# Altium footprint library ConnectMedical.PcbLib: 70 footprints (part 4 of 5)
Each footprint in its own frame and in the unit in brackets; x right, y up, seen from the top. Pads: shape width x height; smd on the part's side, far side on the other; paste and mask are expansions set on the pad; w line width, h text height; cw(c..) or ccw(c..) is an arc to the next point about the centre after c.
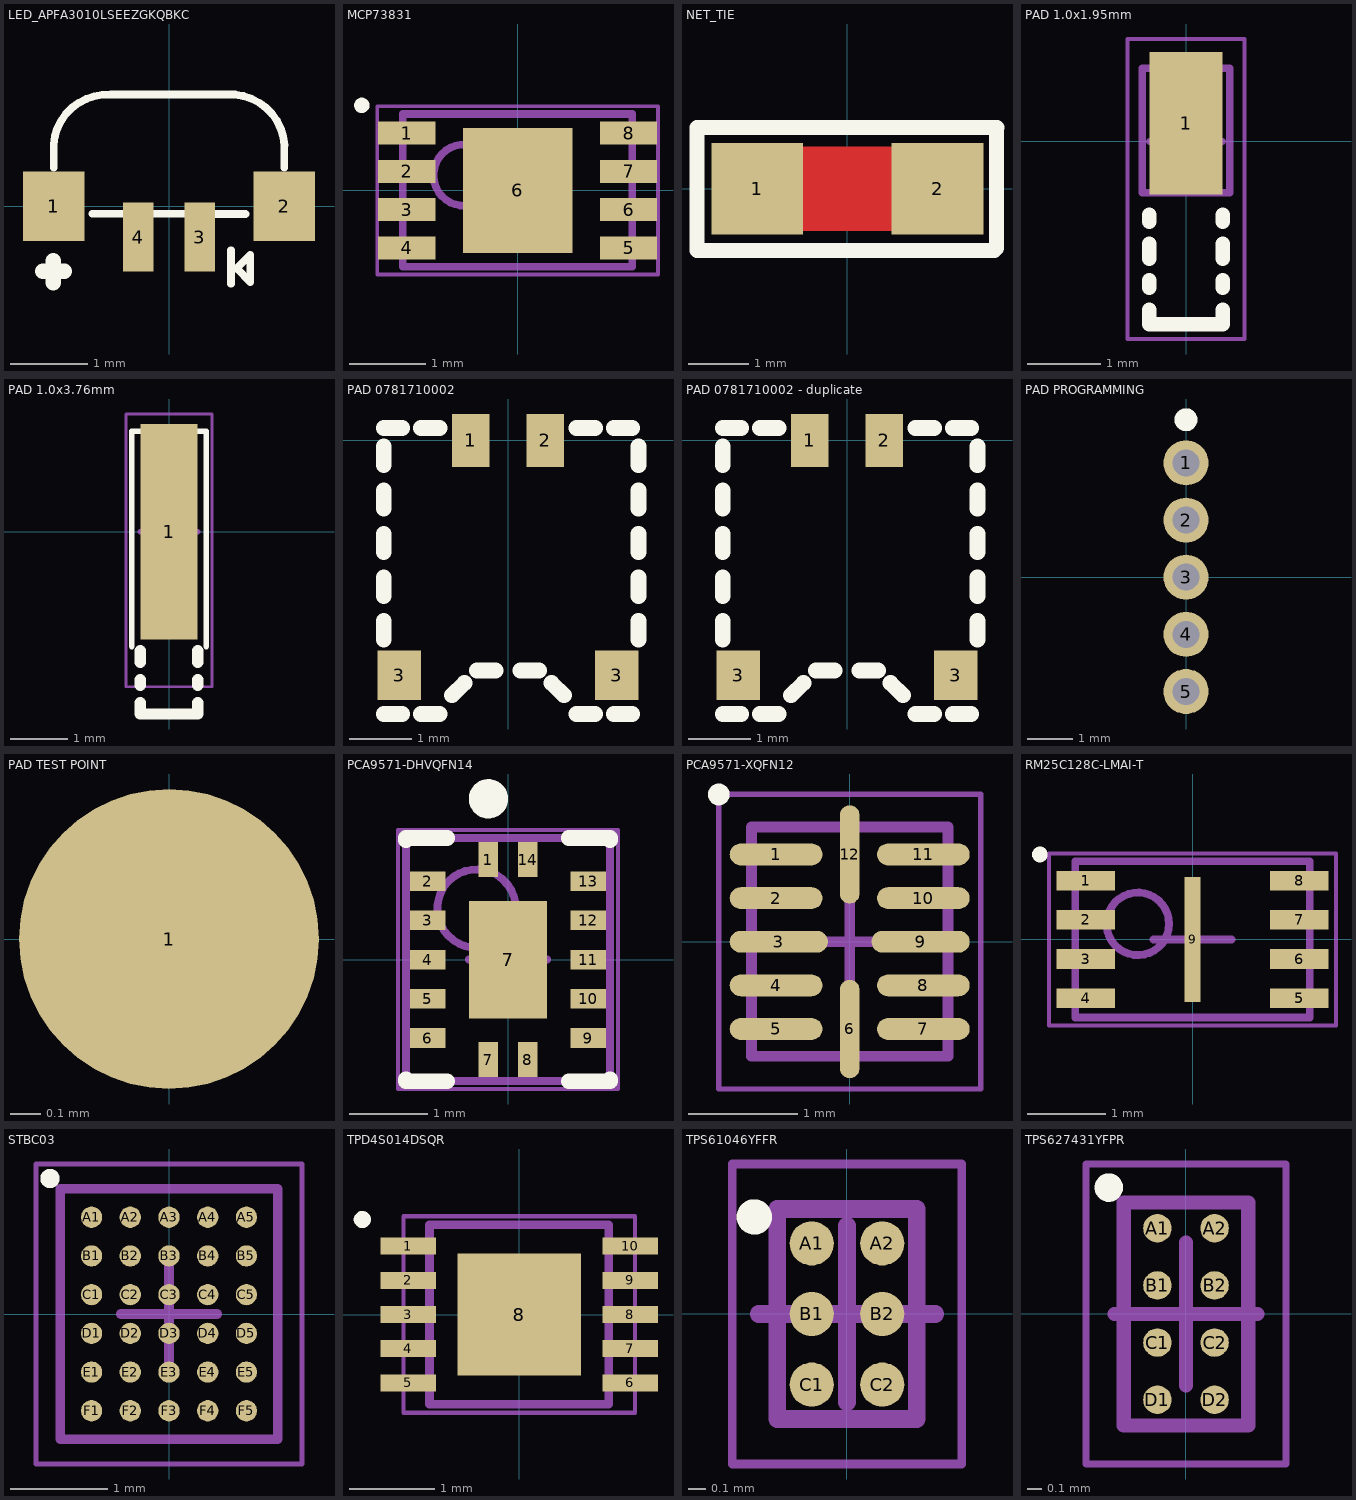
[diagram p3: the footprints below, top view; thin cyan lines are the x and y axes]

## LED_APFA3010LSEEZGKQBKC [mm] "LED_APFA3010LSEEZGKQBKC"
pads (4):
  rect 0.8x0.9 smd: 1(-1.5,0) 2(1.5,0)
  rect 0.4x0.9 smd: 3(0.4,-0.4) 4(-0.4,-0.4)
Top Overlay:
  lines w0.1: -1.5,0.5 -1.499,0.8 cw(c-0.802,0.753) -0.755,1.449 ; -0.997,-0.098 -0.604,-0.098 ; -0.753,1.453 0.749,1.453 cw(c0.796,0.748) 1.501,0.795 ; -0.205,-0.099 0.2,-0.099 ; 0.604,-0.101 0.994,-0.101 ; 0.806,-1.006 0.806,-0.572 ; 1.5,0.5 1.5,0.8 ; 0.879,-0.808 1.057,-0.63 1.057,-0.987 0.879,-0.808
  lines w0.2: -1.642,-0.845 -1.359,-0.845 ; -1.507,-0.993 -1.507,-0.71
3D body "APFA3010.STEP": height 1.01, standoff 0.01, extent -1.5,-0.047 1.5,1.456
3D body: height 1.1, standoff 0.9, extent -1.198,0.125 -0.999,0.325

## MCP73831 [mm] "IC CONTROLLER LI-ION 4.2V 8DFN"
height 1
pads (9):
  rect 0.75x0.3 smd: 1(-1.45,0.75) 2(-1.45,0.25) 3(-1.45,-0.25) 4(-1.45,-0.75) 5(1.45,-0.75) 6(1.45,-0.25) 7(1.45,0.25) 8(1.45,0.75)
  rect 1.43x1.63 smd: 6(0,0)
Top Overlay:
  circle w0.1: c-2.037,1.112 r0.05
Mechanical 13:
  circle w0.1: c-0.7,0.2 r0.4
  lines w0.1: -1.5,-1 -1.5,1 1.5,1 1.5,-1 -1.5,-1
Mechanical 15:
  lines w0.05: -1.835,-1.1 -1.835,1.1 1.835,1.1 1.835,-1.1 -1.835,-1.1
  lines w0.1: -0.5,0 0.5,0 ; 0,-0.5 0,0.5
3D body "MCP73831.step": height 1, standoff 0, extent -1.55,-1 1.55,1

## NET_TIE [mil]
pads (2):
  rect 60x60 smd paste-39.37 mask-43.39: 1(-59.06,0) 2(59.06,0)
Top Layer:
  rectangle: -31.5,-27.56 31.5,27.56
Top Overlay:
  lines w9.84: -98.42,-40.34 -98.42,39.9 97.98,39.9 97.54,39.46 97.54,-39.01 96.21,-40.34 -98.42,-40.34

## PAD 1.0x1.95mm [mm] "MICRO UNIVERSAL CONTACT Z 3.5MM"
height 0.6
pads (1):
  rect 1x1.95 smd: 1(0,0.25)
Top Overlay:
  lines w0.2: -0.5,-2.3 -0.5,-2.5 0.5,-2.5 0.5,-2.3 ; -0.5,-2 -0.5,-1.9 ; -0.5,-1.6 -0.5,-1.4 ; -0.5,-1.1 -0.5,-1 ; 0.5,-2 0.5,-1.9 ; 0.5,-1.6 0.5,-1.4 ; 0.5,-1.1 0.5,-1
Mechanical 13:
  lines w0.1: -0.6,-0.7 -0.6,1 0.6,1 0.6,-0.7 -0.6,-0.7
Mechanical 15:
  lines w0.05: -0.8,-2.7 -0.8,1.4 0.8,1.4 0.8,-2.7 -0.8,-2.7
  lines w0.1: -0.5,0 0.5,0 ; 0,-0.5 0,0.5
3D body "0180-004-DM-0085.step": height 3.5, standoff 0, extent -0.48,-2.59 0.48,1.2

## PAD 1.0x3.76mm [mm] "UNIVERSAL CONTACT 2.5MM SMD"
height 0.6
pads (1):
  rect 1x3.76 smd mask+0.08: 1(0,0)
Top Overlay:
  lines w0.1: -0.65,-2 -0.65,1.75 0.65,1.75 0.65,-2
  lines w0.2: -0.5,-2.975 -0.5,-3.175 0.5,-3.175 0.5,-2.975 ; -0.5,-2.675 -0.5,-2.575 ; -0.5,-2.275 -0.5,-2.075 ; 0.5,-2.675 0.5,-2.575 ; 0.5,-2.275 0.5,-2.075
Mechanical 15:
  lines w0.05: -0.75,-2.7 0.75,-2.7 0.75,2.05 -0.75,2.05 -0.75,-2.7
  lines w0.1: -0.5,0 0.5,0 ; 0,-0.5 0,0.5
3D body "120220-0161.step": height 2.5, standoff 0, extent -0.49,-3.141 0.49,1.775

## PAD 0781710002 [mm] "PAD 1.20MM WTB HEADER VERT 2POS"
pads (4):
  rect 0.6x0.85 smd: 1(-0.6,0) 2(0.6,0)
  rect 0.7x0.8 smd: 3(-1.75,-3.775) 3(1.75,-3.775)
Top Overlay:
  lines w0.254: -2,-4.4 -1.7,-4.4 ; -2,-3.2 -2,-2.9 ; -2,-2.5 -2,-2.2 ; -2,-1.8 -2,-1.5 ; -2,-1.1 -2,-0.8 ; -2,-0.4 -2,-0.1 ; -2,0.2 -1.7,0.2 ; -1.4,-4.4 -1.1,-4.4 ; -1.4,0.2 -1.1,0.2 ; -0.9,-4.1 -0.7,-3.9 ; -0.5,-3.7 -0.2,-3.7 ; 0.2,-3.7 0.5,-3.7 ; 0.7,-3.9 0.9,-4.1 ; 1.1,-4.4 1.4,-4.4 ; 1.1,0.2 1.4,0.2 ; 1.7,-4.4 2,-4.4 ; 1.7,0.2 2,0.2 ; 2.1,-3.2 2.1,-2.9 ; 2.1,-2.5 2.1,-2.2 ; 2.1,-1.8 2.1,-1.5 ; 2.1,-1.1 2.1,-0.8 ; 2.1,-0.4 2.1,-0.1
3D body "781710002.stp": height 1.43, standoff -0.02, extent -2.05,-4.33 2.15,0.2

## PAD 0781710002 - duplicate [mm] "PAD 1.20MM WTB HEADER VERT 2POS"
pads (4):
  rect 0.6x0.85 smd: 1(-0.6,0) 2(0.6,0)
  rect 0.7x0.8 smd: 3(-1.75,-3.775) 3(1.75,-3.775)
Top Overlay:
  lines w0.254: -2,-4.4 -1.7,-4.4 ; -2,-3.2 -2,-2.9 ; -2,-2.5 -2,-2.2 ; -2,-1.8 -2,-1.5 ; -2,-1.1 -2,-0.8 ; -2,-0.4 -2,-0.1 ; -2,0.2 -1.7,0.2 ; -1.4,-4.4 -1.1,-4.4 ; -1.4,0.2 -1.1,0.2 ; -0.9,-4.1 -0.7,-3.9 ; -0.5,-3.7 -0.2,-3.7 ; 0.2,-3.7 0.5,-3.7 ; 0.7,-3.9 0.9,-4.1 ; 1.1,-4.4 1.4,-4.4 ; 1.1,0.2 1.4,0.2 ; 1.7,-4.4 2,-4.4 ; 1.7,0.2 2,0.2 ; 2.1,-3.2 2.1,-2.9 ; 2.1,-2.5 2.1,-2.2 ; 2.1,-1.8 2.1,-1.5 ; 2.1,-1.1 2.1,-0.8 ; 2.1,-0.4 2.1,-0.1
3D body "781710002.stp": height 1.43, standoff -0.02, extent -2.1,-4.35 2.1,0.18

## PAD PROGRAMMING [mm] "Programming Points"
pads (5):
  round 1 hole 0.6 paste-2 mask+0: 1(0,2.54) 2(0,1.27) 3(0,0) 4(0,-1.27) 5(0,-2.54)
Top Overlay:
  circle w0.254: c0,3.5 r0.127

## PAD TEST POINT [mm] "Testing Point"
pads (1):
  round 1 smd paste-2 mask+0: 1(0,0)

## PCA9571-DHVQFN14 [mm] "PQFN, 14-Leads, Body 2.50x3.00mm, Pitch 0.50mm, Thermal Pad 1.00x1.50mm, IPC High Density"
height 1
pads (15):
  rect 0.25x0.45 smd mask+0.05: 1(-0.25,1.275) 7(-0.25,-1.275) 8(0.25,-1.275) 14(0.25,1.275)
  rect 0.45x0.25 smd mask+0.05: 2(-1.025,1) 3(-1.025,0.5) 4(-1.025,0) 5(-1.025,-0.5) 6(-1.025,-1) 9(1.025,-1) 10(1.025,-0.5) 11(1.025,0) 12(1.025,0.5) 13(1.025,1)
  rect 1x1.5 smd mask+0.05: 7(0,0)
Top Overlay:
  circle w0.25: c-0.25,2.05 r0.125
  lines w0.2: -1.3,-1.525 -1.3,-1.55 -0.775,-1.55 ; -1.3,1.525 -1.3,1.55 -0.775,1.55 ; 0.775,-1.55 1.3,-1.55 1.3,-1.525 ; 0.775,1.55 1.3,1.55 1.3,1.525
Mechanical 13:
  circle w0.1: c-0.4,0.65 r0.5
  lines w0.1: -1.3,-1.55 -1.3,1.55 1.3,1.55 1.3,-1.55 -1.3,-1.55
Mechanical 15:
  lines w0.05: -1.4,-1.65 -1.4,1.65 1.4,1.65 1.4,-1.65 -1.4,-1.65
  lines w0.1: -0.5,0 0.5,0 ; 0,-0.5 0,0.5
3D body "PCA9571-DHVQFN14.step": height 1, standoff 0, extent -1.3,-1.55 1.3,1.55

## PCA9571-XQFN12 [mm] "QFN, 12-Leads, Body 1.70x2.00mm, Pitch 0.40mm, IPC High Density"
height 0.5
pads (12):
  oval 0.85x0.2 smd mask+0.04: 1(-0.675,0.8) 2(-0.675,0.4) 4(-0.675,-0.4) 5(-0.675,-0.8) 7(0.675,-0.8) 8(0.675,-0.4) 10(0.675,0.4) 11(0.675,0.8)
  oval 0.9x0.2 smd mask+0.05: 3(-0.65,0) 9(0.65,0)
  oval 0.18x0.9 smd mask+0.05: 6(0,-0.8)
  oval 0.18x0.9 smd mask+0.04: 12(0,0.8)
Top Overlay:
  circle w0.1: c-1.2,1.35 r0.05
Mechanical 13:
  lines w0.1: -0.9,-1.05 0.9,-1.05 0.9,1.05 -0.9,1.05 -0.9,-1.05
Mechanical 15:
  lines w0.05: -1.2,-1.35 1.2,-1.35 1.2,1.35 -1.2,1.35 -1.2,-1.35
  lines w0.1: -0.5,0 0.5,0 ; 0,-0.5 0,0.5
3D body "QFN127P600-8N.step": height 0.5, standoff 0, extent -0.901,-1.051 0.901,1.051

## RM25C128C-LMAI-T [mm] "IC EEPROM 128KBIT 10MHZ 8DFN"
height 0.6
pads (9):
  rect 0.75x0.25 smd: 1(-1.365,0.75) 2(-1.365,0.25) 3(-1.365,-0.25) 4(-1.365,-0.75) 5(1.365,-0.75) 6(1.365,-0.25) 7(1.365,0.25) 8(1.365,0.75)
  rect 0.2x1.6 smd: 9(0,0)
Top Overlay:
  circle w0.1: c-1.952,1.087 r0.05
Mechanical 13:
  circle w0.1: c-0.7,0.2 r0.4
  lines w0.1: -1.5,-1 1.5,-1 1.5,1 -1.5,1 -1.5,-1
Mechanical 15:
  lines w0.05: -1.835,-1.1 1.835,-1.1 1.835,1.1 -1.835,1.1 -1.835,-1.1
  lines w0.1: -0.5,0 0.5,0 ; 0,-0.5 0,0.5
3D body "RM25C128C-LMAI-T.step": height 0.6, standoff 0, extent -1.55,-1 1.55,1

## STBC03 [mm] "Li-Ion linear battery charger with LDO and load switches"
height 0.6
pads (30):
  round 0.22 smd paste-0.01 mask+0.04: A1(-0.8,1) A3(0,1) A4(0.4,1) A5(0.8,1) B1(-0.8,0.6) B5(0.8,0.6) C1(-0.8,0.2) C3(0,0.2) C5(0.8,0.2) D1(-0.8,-0.2) D3(0,-0.2) D5(0.8,-0.2) E1(-0.8,-0.6) E5(0.8,-0.6) F1(-0.8,-1) F2(-0.4,-1) F3(0,-1) F4(0.4,-1) F5(0.8,-1)
  round 0.22 smd paste-0.05 mask+0.04: A2(-0.4,1) B2(-0.4,0.6) B3(0,0.6) B4(0.4,0.6) C2(-0.4,0.2) C4(0.4,0.2) D2(-0.4,-0.2) D4(0.4,-0.2) E2(-0.4,-0.6) E3(0,-0.6) E4(0.4,-0.6)
Top Overlay:
  circle w0.1: c-1.23,1.4 r0.05
Mechanical 13:
  lines w0.1: -1.125,-1.295 1.125,-1.295 1.125,1.295 -1.125,1.295 -1.125,-1.295
Mechanical 15:
  lines w0.05: -1.375,-1.55 1.375,-1.55 1.375,1.55 -1.375,1.55 -1.375,-1.55
  lines w0.1: -0.5,0 0.5,0 ; 0,-0.5 0,0.5
3D body "STBC03_2.step": height 0.6, standoff 0, extent -1.125,-1.295 1.125,1.295

## TPD4S014DSQR [mm] "IC USB PORT PROTECTION 10SON"
height 0.8
pads (11):
  rect 0.65x0.2 smd mask+0.07: 1(-1.3,0.8) 2(-1.3,0.4) 3(-1.3,0) 4(-1.3,-0.4) 5(-1.3,-0.8) 6(1.3,-0.8) 7(1.3,-0.4) 8(1.3,0) 9(1.3,0.4) 10(1.3,0.8)
  rect 1.45x1.43 smd mask+0.07: 8(0,0)
Top Overlay:
  circle w0.1: c-1.837,1.112 r0.05
Mechanical 13:
  circle w0.1: c-0.25,0.25 r0.4
  lines w0.1: -1.05,-1.05 1.05,-1.05 1.05,1.05 -1.05,1.05 -1.05,-1.05
Mechanical 15:
  lines w0.05: -1.355,-1.15 1.355,-1.15 1.355,1.15 -1.355,1.15 -1.355,-1.15
  lines w0.1: -0.5,0 0.5,0 ; 0,-0.5 0,0.5
3D body "TPD4S014DSQR.step": height 0.8, standoff 0, extent -1.1,-1.05 1.1,1.05

## TPS61046YFFR [mm] "IC LED DRVR RGLTR DIM"
height 0.63
pads (6):
  round 0.25 smd mask+0.045: A1(-0.2,0.4) A2(0.2,0.4) B1(-0.2,0) B2(0.2,0) C1(-0.2,-0.4) C2(0.2,-0.4)
Top Overlay:
  circle w0.1: c-0.525,0.55 r0.05
Mechanical 13:
  lines w0.1: -0.395,-0.595 -0.395,0.595 0.395,0.595 0.395,-0.595 -0.395,-0.595
Mechanical 15:
  lines w0.05: -0.65,-0.85 -0.65,0.85 0.65,0.85 0.65,-0.85 -0.65,-0.85
  lines w0.1: -0.5,0 0.5,0 ; 0,-0.5 0,0.5
3D body "TPS61046YFFR.step": height 0.63, standoff 0, extent -0.395,-0.595 0.395,0.595

## TPS627431YFPR [mm] "IC REG BCK PROG 0.4A SYNC 8DSBGA"
height 0.5
pads (8):
  round 0.2 smd mask+0.07: A1(-0.2,0.6) A2(0.2,0.6) B1(-0.2,0.2) B2(0.2,0.2) C1(-0.2,-0.2) C2(0.2,-0.2) D1(-0.2,-0.6) D2(0.2,-0.6)
Top Overlay:
  circle w0.1: c-0.54,0.885 r0.05
Mechanical 13:
  lines w0.1: -0.435,-0.78 0.435,-0.78 0.435,0.78 -0.435,0.78 -0.435,-0.78
Mechanical 15:
  lines w0.05: -0.7,-1.05 0.7,-1.05 0.7,1.05 -0.7,1.05 -0.7,-1.05
  lines w0.1: -0.5,0 0.5,0 ; 0,-0.5 0,0.5
3D body "TPS627431YFPR.step": height 0.5, standoff 0, extent -0.435,-0.78 0.435,0.78